# Altium integrated library GPDSE.IntLib: 634 symbols (part 4 of 7) (continued)
## PTC
designator R?, comment Value
Positive Temperature Coefficient Thermistor
footprint Thermistor-100mil (Thermistor 100 mil)
pins: 1, 2
text: q

## PushButton_2
designator S?, comment PushButton
Tactile Switch SPST 2 pins
footprint DTS-6.0mm-3.5mm-SMD (Push Button Switch Surface Mount 6.0mm x 3.5mm)
footprint DTS-6.0mm-3.5mm-THT (Push Button Switch Through Role 6.0mm x 3.5mm)
pins: 1, 2

## PushButton_4
designator S?, comment PushButton
Tactile Switch SPST 4 pins
footprint DTS-6.0mm-6.0mm-SMD (Push Button Switch Surface Mount 6.0mm x 6.0mm)
footprint DTS-6.0mm-6.0mm-THT (Push Button Switch Through Role 6.0mm x 6.0mm)
footprint DTS-12.0mm-12.0mm-SMD (Push Button Switch Surface Mount 12.0mm x 12.0mm)
footprint DTS-12.0mm-12.0mm-THT (Push Button Switch Through Role 12.0mm x 12.0mm)
pins: 1, 2, 3, 4

## Resistor
designator R?, comment Value  Power: 1/4 W
Resistor; Tolerance: 5%; Published: 8-Jun-2000; LatestRevisionDate: 17-Jul-2002; LatestRevisionNote: Re-released for DXP Platform.; PackageReference: AXIAL-0.3; Publisher: Altium Limited
footprint 0805R (Chip Resistor; Body 2 x 1.3 mm (LxW typ))
footprint R300-1.5mm (Axial Device, Thru-Hole; 2 Leads; 0.3 in Pin Spacing)
footprint R400-2.0mm (Axial Device, Thru-Hole; 2 Leads; 0.4 in Pin Spacing)
footprint R500-2.5mm (Axial Device, Thru-Hole; 2 Leads; 0.5 in Pin Spacing)
footprint R600-2.5mm (Axial Device, Thru-Hole; 2 Leads; 0.6 in Pin Spacing)
footprint R700-4.0mm (Axial Device, Thru-Hole; 2 Leads; 0.7 in Pin Spacing)
footprint R800-4.0mm (Axial Device, Thru-Hole; 2 Leads; 0.8 in Pin Spacing)
footprint R900-5.0mm (Axial Device, Thru-Hole; 2 Leads; 0.9 in Pin Spacing)
footprint R1000-7.6mm (Axial Device, Thru-Hole; 2 Leads; 1.0 in Pin Spacing)
pins: 1, 2
1 alternate drawing of the same symbol

## ResistorArray_8
designator R?, comment value
Resistor Array
footprint Resistor_Array_8 (Resistor Array 8 Elements, 9 pins; 3D Luis Maduro)
pins: 1, 2, 3, 4, 5, 6, 7, 8, 9

## ResistorPower
designator R?, comment Value  Power: 1 W
Power Resistor; Tolerance: 5%; Published: 8-Jun-2000; LatestRevisionDate: 17-Jul-2002; LatestRevisionNote: Re-released for DXP Platform.; PackageReference: AXIAL-0.3; Publisher: Altium Limited
footprint R-AC01 (Cemented Wirewound Resistor 1 W)
footprint R-AC03 (Cemented Wirewound Resistor 3 W)
footprint R-AC04 (Cemented Wirewound Resistor 4 W)
footprint R-AC05 (Cemented Wirewound Resistor 5 W)
footprint R-AC07 (Cemented Wirewound Resistor 7 W)
footprint R-AC10 (Cemented Wirewound Resistor 10 W)
pins: 1, 2
1 alternate drawing of the same symbol

## Trimpot
designator R?, comment Valor
Trimpot
footprint Trimpot-3006P (Trimpot 3006P)
footprint Trimpot-3006W (Trimpot 3006W)
footprint Trimpot-3006Y (Trimpot 3006Y)
footprint Trimpot-3009P (Trimpot 3009P)
footprint Trimpot-3009Y (Trimpot 3009Y)
footprint Trimpot-3260H (Trimpot 3260H)
footprint Trimpot-3260W (Trimpot 3260W)
footprint Trimpot-3262P (Trimpot 3262P)
footprint Trimpot-3262W (Trimpot 3262W)
footprint Trimpot-3262X (Trimpot 3262X)
footprint Trimpot-3266P (Trimpot 3266P)
footprint Trimpot-3266W (Trimpot 3266W)
footprint Trimpot-3266X (Trimpot 3266X)
footprint Trimpot-3266Y (Trimpot 3266Y)
footprint Trimpot-3266Z (Trimpot 3266Z)
footprint Trimpot-3290H (Trimpot 3290H)
footprint Trimpot-3290P (Trimpot 3290P)
footprint Trimpot-3290W (Trimpot 3290W)
footprint Trimpot-3296P (Trimpot 3296P)
footprint Trimpot-3296W (Trimpot 3296W)
footprint Trimpot-3296X (Trimpot 3296X)
footprint Trimpot-3296Y (Trimpot 3296Y)
footprint Trimpot-3296Z (Trimpot 3296Z)
footprint Trimpot-3299W (Trimpot 3299W)
footprint Trimpot-3299X (Trimpot 3299X)
footprint Trimpot-3299Y (Trimpot 3299Y)
footprint Trimpot-3299Z (Trimpot 3299Z)
pins: 1, 2, 3


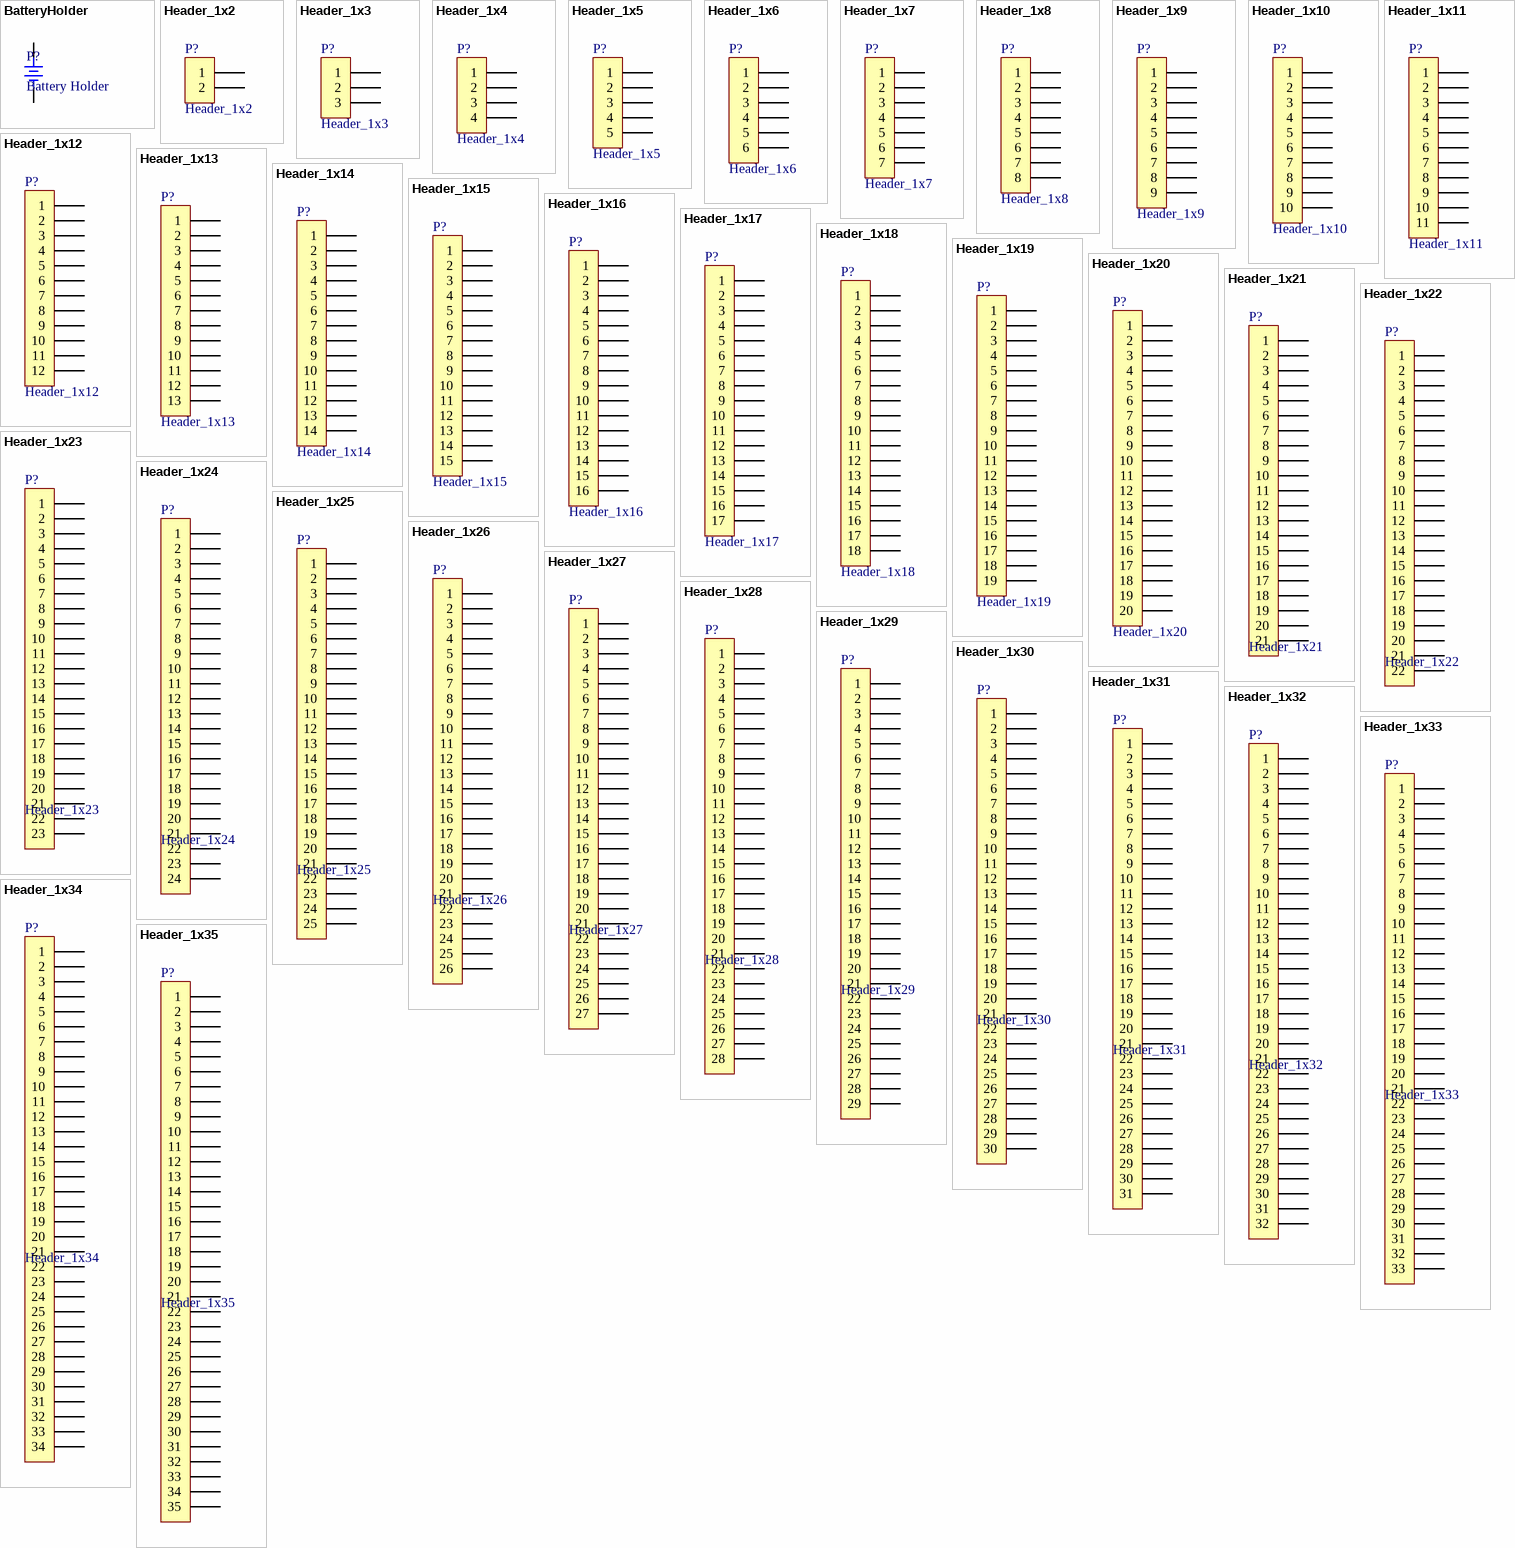
[diagram p20: symbols BatteryHolder to Header_1x35]

## BatteryHolder
designator P?, comment Battery Holder
footprint BH-A23-1 (A23 Battery Holder)
footprint BH-CR2032-1 (CR2032 Battery Holder with Easy Release Clip)
footprint BH-CR2032-2 (CR2032 Battery Holder with Easy Release Clip)
pins: 1 -, 2 +

## Header_1x2
designator P?
Header, 1 Line, 2 Columns, 2 Pins; LatestRevisionDate: 17-Jul-2002; LatestRevisionNote: Re-released for DXP Platform.; Publisher: Altium Limited
footprint HDR-M-1x2-2.54mm-180-9.2mm (Male Header, 1 line, 2 columns, 180 degrees, 9.2 mm length, 3D ASSMANN WSW components)
footprint HDR-M-1x2-2.54mm-180-11.2mm (Male Header, 1 line, 2 columns, 180 degrees, 11.2 mm length, 3D ASSMANN WSW components)
footprint HDR-M-1x2-2.54mm-180-11.6mm (Male Header, 1 line, 2 columns, 180 degrees, 11.6 mm length, 3D ASSMANN WSW components)
footprint HDR-M-1x2-2.54mm-180-12.4mm (Male Header, 1 line, 2 columns, 180 degrees, 12.4 mm length, 3D ASSMANN WSW components)
footprint HDR-M-1x2-2.54mm-180-13.6mm (Male Header, 1 line, 2 columns, 180 degrees, 13.6 mm length, 3D ASSMANN WSW components)
footprint HDR-M-1x2-2.54mm-180-21.1mm (Male Header, 1 line, 2 columns, 180 degrees, 21.1 mm length, 3D ASSMANN WSW components)
footprint HDR-F-1x2-2.54mm-180-8.7mm (Female Header, 1 line, 2 columns, 180 degrees, 8.7 mm length, 3D ASSMANN WSW components)
footprint HDR-M-1x2-2.54mm-90-15.0mm (Male Header, 1 line, 2 columns, 90 degrees, 15.0 mm length, 3D ASSMANN WSW components)
pins: 1, 2

## Header_1x3
designator P?
Header, 1 Line, 3 Columns, 3 Pins; LatestRevisionDate: 17-Jul-2002; LatestRevisionNote: Re-released for DXP Platform.; Publisher: Altium Limited
footprint HDR-M-1x3-2.54mm-180-9.2mm (Male Header, 1 line, 3 columns, 180 degrees, 9.2 mm length, 3D ASSMANN WSW components)
footprint HDR-M-1x3-2.54mm-180-11.2mm (Male Header, 1 line, 3 columns, 180 degrees, 11.2 mm length, 3D ASSMANN WSW components)
footprint HDR-M-1x3-2.54mm-180-11.6mm (Male Header, 1 line, 3 columns, 180 degrees, 11.6 mm length, 3D ASSMANN WSW components)
footprint HDR-M-1x3-2.54mm-180-12.4mm (Male Header, 1 line, 3 columns, 180 degrees, 12.4 mm length, 3D ASSMANN WSW components)
footprint HDR-M-1x3-2.54mm-180-13.6mm (Male Header, 1 line, 3 columns, 180 degrees, 13.6 mm length, 3D ASSMANN WSW components)
footprint HDR-M-1x3-2.54mm-180-21.1mm (Male Header, 1 line, 3 columns, 180 degrees, 21.1 mm length, 3D ASSMANN WSW components)
footprint HDR-F-1x3-2.54mm-180-8.7mm (Female Header, 1 line, 3 columns, 180 degrees, 8.7 mm length, 3D ASSMANN WSW components)
footprint HDR-M-1x3-2.54mm-90-15.0mm (Male Header, 1 line, 3 columns, 90 degrees, 15.0 mm length, 3D ASSMANN WSW components)
pins: 1, 2, 3

## Header_1x4
designator P?
Header, 1 Line, 4 Columns, 4 Pins; LatestRevisionDate: 17-Jul-2002; LatestRevisionNote: Re-released for DXP Platform.; Publisher: Altium Limited
footprint HDR-M-1x4-2.54mm-180-9.2mm (Male Header, 1 line, 4 columns, 180 degrees, 9.2 mm length, 3D ASSMANN WSW components)
footprint HDR-M-1x4-2.54mm-180-11.2mm (Male Header, 1 line, 4 columns, 180 degrees, 11.2 mm length, 3D ASSMANN WSW components)
footprint HDR-M-1x4-2.54mm-180-11.6mm (Male Header, 1 line, 4 columns, 180 degrees, 11.6 mm length, 3D ASSMANN WSW components)
footprint HDR-M-1x4-2.54mm-180-12.4mm (Male Header, 1 line, 4 columns, 180 degrees, 12.4 mm length, 3D ASSMANN WSW components)
footprint HDR-M-1x4-2.54mm-180-13.6mm (Male Header, 1 line, 4 columns, 180 degrees, 13.6 mm length, 3D ASSMANN WSW components)
footprint HDR-M-1x4-2.54mm-180-21.1mm (Male Header, 1 line, 4 columns, 180 degrees, 21.1 mm length, 3D ASSMANN WSW components)
footprint HDR-F-1x4-2.54mm-180-8.7mm (Female Header, 1 line, 4 columns, 180 degrees, 8.7 mm length, 3D ASSMANN WSW components)
footprint HDR-M-1x4-2.54mm-90-15.0mm (Male Header, 1 line, 4 columns, 90 degrees, 15.0 mm length, 3D ASSMANN WSW components)
pins: 1, 2, 3, 4

## Header_1x5
designator P?
Header, 1 Line, 5 Columns, 5 Pins; LatestRevisionDate: 17-Jul-2002; LatestRevisionNote: Re-released for DXP Platform.; Publisher: Altium Limited
footprint HDR-M-1x5-2.54mm-180-9.2mm (Male Header, 1 line, 5 columns, 180 degrees, 9.2 mm length, 3D ASSMANN WSW components)
footprint HDR-M-1x5-2.54mm-180-11.2mm (Male Header, 1 line, 5 columns, 180 degrees, 11.2 mm length, 3D ASSMANN WSW components)
footprint HDR-M-1x5-2.54mm-180-11.6mm (Male Header, 1 line, 5 columns, 180 degrees, 11.6 mm length, 3D ASSMANN WSW components)
footprint HDR-M-1x5-2.54mm-180-12.4mm (Male Header, 1 line, 5 columns, 180 degrees, 12.4 mm length, 3D ASSMANN WSW components)
footprint HDR-M-1x5-2.54mm-180-13.6mm (Male Header, 1 line, 5 columns, 180 degrees, 13.6 mm length, 3D ASSMANN WSW components)
footprint HDR-M-1x5-2.54mm-180-21.1mm (Male Header, 1 line, 5 columns, 180 degrees, 21.1 mm length, 3D ASSMANN WSW components)
footprint HDR-F-1x5-2.54mm-180-8.7mm (Female Header, 1 line, 5 columns, 180 degrees, 8.7 mm length, 3D ASSMANN WSW components)
footprint HDR-M-1x5-2.54mm-90-15.0mm (Male Header, 1 line, 5 columns, 90 degrees, 15.0 mm length, 3D ASSMANN WSW components)
pins: 1, 2, 3, 4, 5

## Header_1x6
designator P?
Header, 1 Line, 6 Columns, 6 Pins; LatestRevisionDate: 17-Jul-2002; LatestRevisionNote: Re-released for DXP Platform.; Publisher: Altium Limited
footprint HDR-M-1x6-2.54mm-180-9.2mm (Male Header, 1 line, 6 columns, 180 degrees, 9.2 mm length, 3D ASSMANN WSW components)
footprint HDR-M-1x6-2.54mm-180-11.2mm (Male Header, 1 line, 6 columns, 180 degrees, 11.2 mm length, 3D ASSMANN WSW components)
footprint HDR-M-1x6-2.54mm-180-11.6mm (Male Header, 1 line, 6 columns, 180 degrees, 11.6 mm length, 3D ASSMANN WSW components)
footprint HDR-M-1x6-2.54mm-180-12.4mm (Male Header, 1 line, 6 columns, 180 degrees, 12.4 mm length, 3D ASSMANN WSW components)
footprint HDR-M-1x6-2.54mm-180-13.6mm (Male Header, 1 line, 6 columns, 180 degrees, 13.6 mm length, 3D ASSMANN WSW components)
footprint HDR-M-1x6-2.54mm-180-21.1mm (Male Header, 1 line, 6 columns, 180 degrees, 21.1 mm length, 3D ASSMANN WSW components)
footprint HDR-F-1x6-2.54mm-180-8.7mm (Female Header, 1 line, 6 columns, 180 degrees, 8.7 mm length, 3D ASSMANN WSW components)
footprint HDR-M-1x6-2.54mm-90-15.0mm (Male Header, 1 line, 6 columns, 90 degrees, 15.0 mm length, 3D ASSMANN WSW components)
pins: 1, 2, 3, 4, 5, 6

## Header_1x7
designator P?
Header, 1 Line, 7 Columns, 7 Pins; LatestRevisionDate: 17-Jul-2002; LatestRevisionNote: Re-released for DXP Platform.; Publisher: Altium Limited
footprint HDR-M-1x7-2.54mm-180-9.2mm (Male Header, 1 line, 7 columns, 180 degrees, 9.2 mm length, 3D ASSMANN WSW components)
footprint HDR-M-1x7-2.54mm-180-11.2mm (Male Header, 1 line, 7 columns, 180 degrees, 11.2 mm length, 3D ASSMANN WSW components)
footprint HDR-M-1x7-2.54mm-180-11.6mm (Male Header, 1 line, 7 columns, 180 degrees, 11.6 mm length, 3D ASSMANN WSW components)
footprint HDR-M-1x7-2.54mm-180-12.4mm (Male Header, 1 line, 7 columns, 180 degrees, 12.4 mm length, 3D ASSMANN WSW components)
footprint HDR-M-1x7-2.54mm-180-13.6mm (Male Header, 1 line, 7 columns, 180 degrees, 13.6 mm length, 3D ASSMANN WSW components)
footprint HDR-M-1x7-2.54mm-180-21.1mm (Male Header, 1 line, 7 columns, 180 degrees, 21.1 mm length, 3D ASSMANN WSW components)
footprint HDR-F-1x7-2.54mm-180-8.7mm (Female Header, 1 line, 7 columns, 180 degrees, 8.7 mm length, 3D ASSMANN WSW components)
footprint HDR-M-1x7-2.54mm-90-15.0mm (Male Header, 1 line, 7 columns, 90 degrees, 15.0 mm length, 3D ASSMANN WSW components)
pins: 1, 2, 3, 4, 5, 6, 7

## Header_1x8
designator P?
Header, 1 Line, 8 Columns, 8 Pins; LatestRevisionDate: 17-Jul-2002; LatestRevisionNote: Re-released for DXP Platform.; Publisher: Altium Limited
footprint HDR-M-1x8-2.54mm-180-9.2mm (Male Header, 1 line, 8 columns, 180 degrees, 9.2 mm length, 3D ASSMANN WSW components)
footprint HDR-M-1x8-2.54mm-180-11.2mm (Male Header, 1 line, 8 columns, 180 degrees, 11.2 mm length, 3D ASSMANN WSW components)
footprint HDR-M-1x8-2.54mm-180-11.6mm (Male Header, 1 line, 8 columns, 180 degrees, 11.6 mm length, 3D ASSMANN WSW components)
footprint HDR-M-1x8-2.54mm-180-12.4mm (Male Header, 1 line, 8 columns, 180 degrees, 12.4 mm length, 3D ASSMANN WSW components)
footprint HDR-M-1x8-2.54mm-180-13.6mm (Male Header, 1 line, 8 columns, 180 degrees, 13.6 mm length, 3D ASSMANN WSW components)
footprint HDR-M-1x8-2.54mm-180-21.1mm (Male Header, 1 line, 8 columns, 180 degrees, 21.1 mm length, 3D ASSMANN WSW components)
footprint HDR-F-1x8-2.54mm-180-8.7mm (Female Header, 1 line, 8 columns, 180 degrees, 8.7 mm length, 3D ASSMANN WSW components)
footprint HDR-M-1x8-2.54mm-90-15.0mm (Male Header, 1 line, 8 columns, 90 degrees, 15.0 mm length, 3D ASSMANN WSW components)
pins: 1, 2, 3, 4, 5, 6, 7, 8

## Header_1x9
designator P?
Header, 1 Line, 9 Columns, 9 Pins; LatestRevisionDate: 17-Jul-2002; LatestRevisionNote: Re-released for DXP Platform.; Publisher: Altium Limited
footprint HDR-M-1x9-2.54mm-180-9.2mm (Male Header, 1 line, 9 columns, 180 degrees, 9.2 mm length, 3D ASSMANN WSW components)
footprint HDR-M-1x9-2.54mm-180-11.2mm (Male Header, 1 line, 9 columns, 180 degrees, 11.2 mm length, 3D ASSMANN WSW components)
footprint HDR-M-1x9-2.54mm-180-11.6mm (Male Header, 1 line, 9 columns, 180 degrees, 11.6 mm length, 3D ASSMANN WSW components)
footprint HDR-M-1x9-2.54mm-180-12.4mm (Male Header, 1 line, 9 columns, 180 degrees, 12.4 mm length, 3D ASSMANN WSW components)
footprint HDR-M-1x9-2.54mm-180-13.6mm (Male Header, 1 line, 9 columns, 180 degrees, 13.6 mm length, 3D ASSMANN WSW components)
footprint HDR-M-1x9-2.54mm-180-21.1mm (Male Header, 1 line, 9 columns, 180 degrees, 21.1 mm length, 3D ASSMANN WSW components)
footprint HDR-F-1x9-2.54mm-180-8.7mm (Female Header, 1 line, 9 columns, 180 degrees, 8.7 mm length, 3D ASSMANN WSW components)
footprint HDR-M-1x9-2.54mm-90-15.0mm (Male Header, 1 line, 9 columns, 90 degrees, 15.0 mm length, 3D ASSMANN WSW components)
pins: 1, 2, 3, 4, 5, 6, 7, 8, 9

## Header_1x10
designator P?
Header, 1 Line, 10 Columns, 10 Pins; LatestRevisionDate: 17-Jul-2002; LatestRevisionNote: Re-released for DXP Platform.; Publisher: Altium Limited
footprint HDR-M-1x10-2.54mm-180-9.2mm (Male Header, 1 line, 10 columns, 180 degrees, 9.2 mm length, 3D ASSMANN WSW components)
footprint HDR-M-1x10-2.54mm-180-11.2mm (Male Header, 1 line, 10 columns, 180 degrees, 11.2 mm length, 3D ASSMANN WSW components)
footprint HDR-M-1x10-2.54mm-180-11.6mm (Male Header, 1 line, 10 columns, 180 degrees, 11.6 mm length, 3D ASSMANN WSW components)
footprint HDR-M-1x10-2.54mm-180-12.4mm (Male Header, 1 line, 10 columns, 180 degrees, 12.4 mm length, 3D ASSMANN WSW components)
footprint HDR-M-1x10-2.54mm-180-13.6mm (Male Header, 1 line, 10 columns, 180 degrees, 13.6 mm length, 3D ASSMANN WSW components)
footprint HDR-M-1x10-2.54mm-180-21.1mm (Male Header, 1 line, 10 columns, 180 degrees, 21.1 mm length, 3D ASSMANN WSW components)
footprint HDR-F-1x10-2.54mm-180-8.7mm (Female Header, 1 line, 10 columns, 180 degrees, 8.7 mm length, 3D ASSMANN WSW components)
footprint HDR-M-1x10-2.54mm-90-15.0mm (Male Header, 1 line, 10 columns, 90 degrees, 15.0 mm length, 3D ASSMANN WSW components)
pins: 1, 2, 3, 4, 5, 6, 7, 8, 9, 10

## Header_1x11
designator P?
Header, 1 Line, 11 Columns, 11 Pins; LatestRevisionDate: 17-Jul-2002; LatestRevisionNote: Re-released for DXP Platform.; Publisher: Altium Limited
footprint HDR-M-1x11-2.54mm-180-9.2mm (Male Header, 1 line, 11 columns, 180 degrees, 9.2 mm length, 3D ASSMANN WSW components)
footprint HDR-M-1x11-2.54mm-180-11.2mm (Male Header, 1 line, 11 columns, 180 degrees, 11.2 mm length, 3D ASSMANN WSW components)
footprint HDR-M-1x11-2.54mm-180-11.6mm (Male Header, 1 line, 11 columns, 180 degrees, 11.6 mm length, 3D ASSMANN WSW components)
footprint HDR-M-1x11-2.54mm-180-12.4mm (Male Header, 1 line, 11 columns, 180 degrees, 12.4 mm length, 3D ASSMANN WSW components)
footprint HDR-M-1x11-2.54mm-180-13.6mm (Male Header, 1 line, 11 columns, 180 degrees, 13.6 mm length, 3D ASSMANN WSW components)
footprint HDR-M-1x11-2.54mm-180-21.1mm (Male Header, 1 line, 11 columns, 180 degrees, 21.1 mm length, 3D ASSMANN WSW components)
footprint HDR-F-1x11-2.54mm-180-8.7mm (Female Header, 1 line, 11 columns, 180 degrees, 8.7 mm length, 3D ASSMANN WSW components)
footprint HDR-M-1x11-2.54mm-90-15.0mm (Male Header, 1 line, 11 columns, 90 degrees, 15.0 mm length, 3D ASSMANN WSW components)
pins: 1, 2, 3, 4, 5, 6, 7, 8, 9, 10, 11

## Header_1x12
designator P?
Header, 1 Line, 12 Columns, 12 Pins; LatestRevisionDate: 17-Jul-2002; LatestRevisionNote: Re-released for DXP Platform.; Publisher: Altium Limited
footprint HDR-M-1x12-2.54mm-180-9.2mm (Male Header, 1 line, 12 columns, 180 degrees, 9.2 mm length, 3D ASSMANN WSW components)
footprint HDR-M-1x12-2.54mm-180-11.2mm (Male Header, 1 line, 12 columns, 180 degrees, 11.2 mm length, 3D ASSMANN WSW components)
footprint HDR-M-1x12-2.54mm-180-11.6mm (Male Header, 1 line, 12 columns, 180 degrees, 11.6 mm length, 3D ASSMANN WSW components)
footprint HDR-M-1x12-2.54mm-180-12.4mm (Male Header, 1 line, 12 columns, 180 degrees, 12.4 mm length, 3D ASSMANN WSW components)
footprint HDR-M-1x12-2.54mm-180-13.6mm (Male Header, 1 line, 12 columns, 180 degrees, 13.6 mm length, 3D ASSMANN WSW components)
footprint HDR-M-1x12-2.54mm-180-21.1mm (Male Header, 1 line, 12 columns, 180 degrees, 21.1 mm length, 3D ASSMANN WSW components)
footprint HDR-F-1x12-2.54mm-180-8.7mm (Female Header, 1 line, 12 columns, 180 degrees, 8.7 mm length, 3D ASSMANN WSW components)
footprint HDR-M-1x12-2.54mm-90-15.0mm (Male Header, 1 line, 12 columns, 90 degrees, 15.0 mm length, 3D ASSMANN WSW components)
pins: 1, 2, 3, 4, 5, 6, 7, 8, 9, 10, 11, 12

## Header_1x13
designator P?
Header, 1 Line, 13 Columns, 13 Pins; LatestRevisionDate: 17-Jul-2002; LatestRevisionNote: Re-released for DXP Platform.; Publisher: Altium Limited
footprint HDR-M-1x13-2.54mm-180-9.2mm (Male Header, 1 line, 13 columns, 180 degrees, 9.2 mm length, 3D ASSMANN WSW components)
footprint HDR-M-1x13-2.54mm-180-11.2mm (Male Header, 1 line, 13 columns, 180 degrees, 11.2 mm length, 3D ASSMANN WSW components)
footprint HDR-M-1x13-2.54mm-180-11.6mm (Male Header, 1 line, 13 columns, 180 degrees, 11.6 mm length, 3D ASSMANN WSW components)
footprint HDR-M-1x13-2.54mm-180-12.4mm (Male Header, 1 line, 13 columns, 180 degrees, 12.4 mm length, 3D ASSMANN WSW components)
footprint HDR-M-1x13-2.54mm-180-13.6mm (Male Header, 1 line, 13 columns, 180 degrees, 13.6 mm length, 3D ASSMANN WSW components)
footprint HDR-M-1x13-2.54mm-180-21.1mm (Male Header, 1 line, 13 columns, 180 degrees, 21.1 mm length, 3D ASSMANN WSW components)
footprint HDR-F-1x13-2.54mm-180-8.7mm (Female Header, 1 line, 13 columns, 180 degrees, 8.7 mm length, 3D ASSMANN WSW components)
footprint HDR-M-1x13-2.54mm-90-15.0mm (Male Header, 1 line, 13 columns, 90 degrees, 15.0 mm length, 3D ASSMANN WSW components)
pins: 1, 2, 3, 4, 5, 6, 7, 8, 9, 10, 11, 12, 13

## Header_1x14
designator P?
Header, 1 Line, 14 Columns, 14 Pins; LatestRevisionDate: 17-Jul-2002; LatestRevisionNote: Re-released for DXP Platform.; Publisher: Altium Limited
footprint HDR-M-1x14-2.54mm-180-9.2mm (Male Header, 1 line, 14 columns, 180 degrees, 9.2 mm length, 3D ASSMANN WSW components)
footprint HDR-M-1x14-2.54mm-180-11.2mm (Male Header, 1 line, 14 columns, 180 degrees, 11.2 mm length, 3D ASSMANN WSW components)
footprint HDR-M-1x14-2.54mm-180-11.6mm (Male Header, 1 line, 14 columns, 180 degrees, 11.6 mm length, 3D ASSMANN WSW components)
footprint HDR-M-1x14-2.54mm-180-12.4mm (Male Header, 1 line, 14 columns, 180 degrees, 12.4 mm length, 3D ASSMANN WSW components)
footprint HDR-M-1x14-2.54mm-180-13.6mm (Male Header, 1 line, 14 columns, 180 degrees, 13.6 mm length, 3D ASSMANN WSW components)
footprint HDR-M-1x14-2.54mm-180-21.1mm (Male Header, 1 line, 14 columns, 180 degrees, 21.1 mm length, 3D ASSMANN WSW components)
footprint HDR-F-1x14-2.54mm-180-8.7mm (Female Header, 1 line, 14 columns, 180 degrees, 8.7 mm length, 3D ASSMANN WSW components)
footprint HDR-M-1x14-2.54mm-90-15.0mm (Male Header, 1 line, 14 columns, 90 degrees, 15.0 mm length, 3D ASSMANN WSW components)
pins: 1, 2, 3, 4, 5, 6, 7, 8, 9, 10, 11, 12, 13, 14

## Header_1x15
designator P?
Header, 1 Line, 15 Columns, 15 Pins; LatestRevisionDate: 17-Jul-2002; LatestRevisionNote: Re-released for DXP Platform.; Publisher: Altium Limited
footprint HDR-M-1x15-2.54mm-180-9.2mm (Male Header, 1 line, 15 columns, 180 degrees, 9.2 mm length, 3D ASSMANN WSW components)
footprint HDR-M-1x15-2.54mm-180-11.2mm (Male Header, 1 line, 15 columns, 180 degrees, 11.2 mm length, 3D ASSMANN WSW components)
footprint HDR-M-1x15-2.54mm-180-11.6mm (Male Header, 1 line, 15 columns, 180 degrees, 11.6 mm length, 3D ASSMANN WSW components)
footprint HDR-M-1x15-2.54mm-180-12.4mm (Male Header, 1 line, 15 columns, 180 degrees, 12.4 mm length, 3D ASSMANN WSW components)
footprint HDR-M-1x15-2.54mm-180-13.6mm (Male Header, 1 line, 15 columns, 180 degrees, 13.6 mm length, 3D ASSMANN WSW components)
footprint HDR-M-1x15-2.54mm-180-21.1mm (Male Header, 1 line, 15 columns, 180 degrees, 21.1 mm length, 3D ASSMANN WSW components)
footprint HDR-F-1x15-2.54mm-180-8.7mm (Female Header, 1 line, 15 columns, 180 degrees, 8.7 mm length, 3D ASSMANN WSW components)
footprint HDR-M-1x15-2.54mm-90-15.0mm (Male Header, 1 line, 15 columns, 90 degrees, 15.0 mm length, 3D ASSMANN WSW components)
pins: 1, 2, 3, 4, 5, 6, 7, 8, 9, 10, 11, 12, 13, 14, 15

## Header_1x16
designator P?
Header, 1 Line, 16 Columns, 16 Pins; LatestRevisionDate: 17-Jul-2002; LatestRevisionNote: Re-released for DXP Platform.; Publisher: Altium Limited
footprint HDR-M-1x16-2.54mm-180-9.2mm (Male Header, 1 line, 16 columns, 180 degrees, 9.2 mm length, 3D ASSMANN WSW components)
footprint HDR-M-1x16-2.54mm-180-11.2mm (Male Header, 1 line, 16 columns, 180 degrees, 11.2 mm length, 3D ASSMANN WSW components)
footprint HDR-M-1x16-2.54mm-180-11.6mm (Male Header, 1 line, 16 columns, 180 degrees, 11.6 mm length, 3D ASSMANN WSW components)
footprint HDR-M-1x16-2.54mm-180-12.4mm (Male Header, 1 line, 16 columns, 180 degrees, 12.4 mm length, 3D ASSMANN WSW components)
footprint HDR-M-1x16-2.54mm-180-13.6mm (Male Header, 1 line, 16 columns, 180 degrees, 13.6 mm length, 3D ASSMANN WSW components)
footprint HDR-M-1x16-2.54mm-180-21.1mm (Male Header, 1 line, 16 columns, 180 degrees, 21.1 mm length, 3D ASSMANN WSW components)
footprint HDR-F-1x16-2.54mm-180-8.7mm (Female Header, 1 line, 16 columns, 180 degrees, 8.7 mm length, 3D ASSMANN WSW components)
footprint HDR-M-1x16-2.54mm-90-15.0mm (Male Header, 1 line, 16 columns, 90 degrees, 15.0 mm length, 3D ASSMANN WSW components)
pins: 1, 2, 3, 4, 5, 6, 7, 8, 9, 10, 11, 12, 13, 14, 15, 16

## Header_1x17
designator P?
Header, 1 Line, 17 Columns, 17 Pins; LatestRevisionDate: 17-Jul-2002; LatestRevisionNote: Re-released for DXP Platform.; Publisher: Altium Limited
footprint HDR-M-1x17-2.54mm-180-9.2mm (Male Header, 1 line, 17 columns, 180 degrees, 9.2 mm length, 3D ASSMANN WSW components)
footprint HDR-M-1x17-2.54mm-180-11.2mm (Male Header, 1 line, 17 columns, 180 degrees, 11.2 mm length, 3D ASSMANN WSW components)
footprint HDR-M-1x17-2.54mm-180-11.6mm (Male Header, 1 line, 17 columns, 180 degrees, 11.6 mm length, 3D ASSMANN WSW components)
footprint HDR-M-1x17-2.54mm-180-12.4mm (Male Header, 1 line, 17 columns, 180 degrees, 12.4 mm length, 3D ASSMANN WSW components)
footprint HDR-M-1x17-2.54mm-180-13.6mm (Male Header, 1 line, 17 columns, 180 degrees, 13.6 mm length, 3D ASSMANN WSW components)
footprint HDR-M-1x17-2.54mm-180-21.1mm (Male Header, 1 line, 17 columns, 180 degrees, 21.1 mm length, 3D ASSMANN WSW components)
footprint HDR-F-1x17-2.54mm-180-8.7mm (Female Header, 1 line, 17 columns, 180 degrees, 8.7 mm length, 3D ASSMANN WSW components)
footprint HDR-M-1x17-2.54mm-90-15.0mm (Male Header, 1 line, 17 columns, 90 degrees, 15.0 mm length, 3D ASSMANN WSW components)
pins: 1, 2, 3, 4, 5, 6, 7, 8, 9, 10, 11, 12, 13, 14, 15, 16, 17

## Header_1x18
designator P?
Header, 1 Line, 18 Columns, 18 Pins; LatestRevisionDate: 17-Jul-2002; LatestRevisionNote: Re-released for DXP Platform.; Publisher: Altium Limited
footprint HDR-M-1x18-2.54mm-180-9.2mm (Male Header, 1 line, 18 columns, 180 degrees, 9.2 mm length, 3D ASSMANN WSW components)
footprint HDR-M-1x18-2.54mm-180-11.2mm (Male Header, 1 line, 18 columns, 180 degrees, 11.2 mm length, 3D ASSMANN WSW components)
footprint HDR-M-1x18-2.54mm-180-11.6mm (Male Header, 1 line, 18 columns, 180 degrees, 11.6 mm length, 3D ASSMANN WSW components)
footprint HDR-M-1x18-2.54mm-180-12.4mm (Male Header, 1 line, 18 columns, 180 degrees, 12.4 mm length, 3D ASSMANN WSW components)
footprint HDR-M-1x18-2.54mm-180-13.6mm (Male Header, 1 line, 18 columns, 180 degrees, 13.6 mm length, 3D ASSMANN WSW components)
footprint HDR-M-1x18-2.54mm-180-21.1mm (Male Header, 1 line, 18 columns, 180 degrees, 21.1 mm length, 3D ASSMANN WSW components)
footprint HDR-F-1x18-2.54mm-180-8.7mm (Female Header, 1 line, 18 columns, 180 degrees, 8.7 mm length, 3D ASSMANN WSW components)
footprint HDR-M-1x18-2.54mm-90-15.0mm (Male Header, 1 line, 18 columns, 90 degrees, 15.0 mm length, 3D ASSMANN WSW components)
pins: 1, 2, 3, 4, 5, 6, 7, 8, 9, 10, 11, 12, 13, 14, 15, 16, 17, 18

## Header_1x19
designator P?
Header, 1 Line, 19 Columns, 19 Pins; LatestRevisionDate: 17-Jul-2002; LatestRevisionNote: Re-released for DXP Platform.; Publisher: Altium Limited
footprint HDR-M-1x19-2.54mm-180-9.2mm (Male Header, 1 line, 19 columns, 180 degrees, 9.2 mm length, 3D ASSMANN WSW components)
footprint HDR-M-1x19-2.54mm-180-11.2mm (Male Header, 1 line, 19 columns, 180 degrees, 11.2 mm length, 3D ASSMANN WSW components)
footprint HDR-M-1x19-2.54mm-180-11.6mm (Male Header, 1 line, 19 columns, 180 degrees, 11.6 mm length, 3D ASSMANN WSW components)
footprint HDR-M-1x19-2.54mm-180-12.4mm (Male Header, 1 line, 19 columns, 180 degrees, 12.4 mm length, 3D ASSMANN WSW components)
footprint HDR-M-1x19-2.54mm-180-13.6mm (Male Header, 1 line, 19 columns, 180 degrees, 13.6 mm length, 3D ASSMANN WSW components)
footprint HDR-M-1x19-2.54mm-180-21.1mm (Male Header, 1 line, 19 columns, 180 degrees, 21.1 mm length, 3D ASSMANN WSW components)
footprint HDR-F-1x19-2.54mm-180-8.7mm (Female Header, 1 line, 19 columns, 180 degrees, 8.7 mm length, 3D ASSMANN WSW components)
footprint HDR-M-1x19-2.54mm-90-15.0mm (Male Header, 1 line, 19 columns, 90 degrees, 15.0 mm length, 3D ASSMANN WSW components)
pins: 1, 2, 3, 4, 5, 6, 7, 8, 9, 10, 11, 12, 13, 14, 15, 16, 17, 18, 19

## Header_1x20
designator P?
Header, 1 Line, 20 Columns, 20 Pins; LatestRevisionDate: 17-Jul-2002; LatestRevisionNote: Re-released for DXP Platform.; Publisher: Altium Limited
footprint HDR-M-1x20-2.54mm-180-9.2mm (Male Header, 1 line, 20 columns, 180 degrees, 9.2 mm length, 3D ASSMANN WSW components)
footprint HDR-M-1x20-2.54mm-180-11.2mm (Male Header, 1 line, 20 columns, 180 degrees, 11.2 mm length, 3D ASSMANN WSW components)
footprint HDR-M-1x20-2.54mm-180-11.6mm (Male Header, 1 line, 20 columns, 180 degrees, 11.6 mm length, 3D ASSMANN WSW components)
footprint HDR-M-1x20-2.54mm-180-12.4mm (Male Header, 1 line, 20 columns, 180 degrees, 12.4 mm length, 3D ASSMANN WSW components)
footprint HDR-M-1x20-2.54mm-180-13.6mm (Male Header, 1 line, 20 columns, 180 degrees, 13.6 mm length, 3D ASSMANN WSW components)
footprint HDR-M-1x20-2.54mm-180-21.1mm (Male Header, 1 line, 20 columns, 180 degrees, 21.1 mm length, 3D ASSMANN WSW components)
footprint HDR-F-1x20-2.54mm-180-8.7mm (Female Header, 1 line, 20 columns, 180 degrees, 8.7 mm length, 3D ASSMANN WSW components)
footprint HDR-M-1x20-2.54mm-90-15.0mm (Male Header, 1 line, 20 columns, 90 degrees, 15.0 mm length, 3D ASSMANN WSW components)
pins: 1, 2, 3, 4, 5, 6, 7, 8, 9, 10, 11, 12, 13, 14, 15, 16, 17, 18, 19, 20

## Header_1x21
designator P?
Header, 1 Line, 21 Columns, 21 Pins; LatestRevisionDate: 17-Jul-2002; LatestRevisionNote: Re-released for DXP Platform.; Publisher: Altium Limited
footprint HDR-M-1x21-2.54mm-180-9.2mm (Male Header, 1 line, 21 columns, 180 degrees, 9.2 mm length, 3D ASSMANN WSW components)
footprint HDR-M-1x21-2.54mm-180-11.2mm (Male Header, 1 line, 21 columns, 180 degrees, 11.2 mm length, 3D ASSMANN WSW components)
footprint HDR-M-1x21-2.54mm-180-11.6mm (Male Header, 1 line, 21 columns, 180 degrees, 11.6 mm length, 3D ASSMANN WSW components)
footprint HDR-M-1x21-2.54mm-180-12.4mm (Male Header, 1 line, 21 columns, 180 degrees, 12.4 mm length, 3D ASSMANN WSW components)
footprint HDR-M-1x21-2.54mm-180-13.6mm (Male Header, 1 line, 21 columns, 180 degrees, 13.6 mm length, 3D ASSMANN WSW components)
footprint HDR-M-1x21-2.54mm-180-21.1mm (Male Header, 1 line, 21 columns, 180 degrees, 21.1 mm length, 3D ASSMANN WSW components)
footprint HDR-F-1x21-2.54mm-180-8.7mm (Female Header, 1 line, 21 columns, 180 degrees, 8.7 mm length, 3D ASSMANN WSW components)
footprint HDR-M-1x21-2.54mm-90-15.0mm (Male Header, 1 line, 21 columns, 90 degrees, 15.0 mm length, 3D ASSMANN WSW components)
pins: 1, 2, 3, 4, 5, 6, 7, 8, 9, 10, 11, 12, 13, 14, 15, 16, 17, 18, 19, 20, 21

## Header_1x22
designator P?
Header, 1 Line, 22 Columns, 22 Pins; LatestRevisionDate: 17-Jul-2002; LatestRevisionNote: Re-released for DXP Platform.; Publisher: Altium Limited
footprint HDR-M-1x22-2.54mm-180-9.2mm (Male Header, 1 line, 22 columns, 180 degrees, 9.2 mm length, 3D ASSMANN WSW components)
footprint HDR-M-1x22-2.54mm-180-11.2mm (Male Header, 1 line, 22 columns, 180 degrees, 11.2 mm length, 3D ASSMANN WSW components)
footprint HDR-M-1x22-2.54mm-180-11.6mm (Male Header, 1 line, 22 columns, 180 degrees, 11.6 mm length, 3D ASSMANN WSW components)
footprint HDR-M-1x22-2.54mm-180-12.4mm (Male Header, 1 line, 22 columns, 180 degrees, 12.4 mm length, 3D ASSMANN WSW components)
footprint HDR-M-1x22-2.54mm-180-13.6mm (Male Header, 1 line, 22 columns, 180 degrees, 13.6 mm length, 3D ASSMANN WSW components)
footprint HDR-M-1x22-2.54mm-180-21.1mm (Male Header, 1 line, 22 columns, 180 degrees, 21.1 mm length, 3D ASSMANN WSW components)
footprint HDR-F-1x22-2.54mm-180-8.7mm (Female Header, 1 line, 22 columns, 180 degrees, 8.7 mm length, 3D ASSMANN WSW components)
footprint HDR-M-1x22-2.54mm-90-15.0mm (Male Header, 1 line, 22 columns, 90 degrees, 15.0 mm length, 3D ASSMANN WSW components)
pins: 1, 2, 3, 4, 5, 6, 7, 8, 9, 10, 11, 12, 13, 14, 15, 16, 17, 18, 19, 20, 21, 22